# Altium footprint library SMD Passive.PcbLib: 136 footprints (part 8 of 9)
Each footprint in its own frame and in the unit in brackets; x right, y up, seen from the top. Pads: shape width x height; smd on the part's side, far side on the other; paste and mask are expansions set on the pad; w line width, h text height; cw(c..) or ccw(c..) is an arc to the next point about the centre after c.
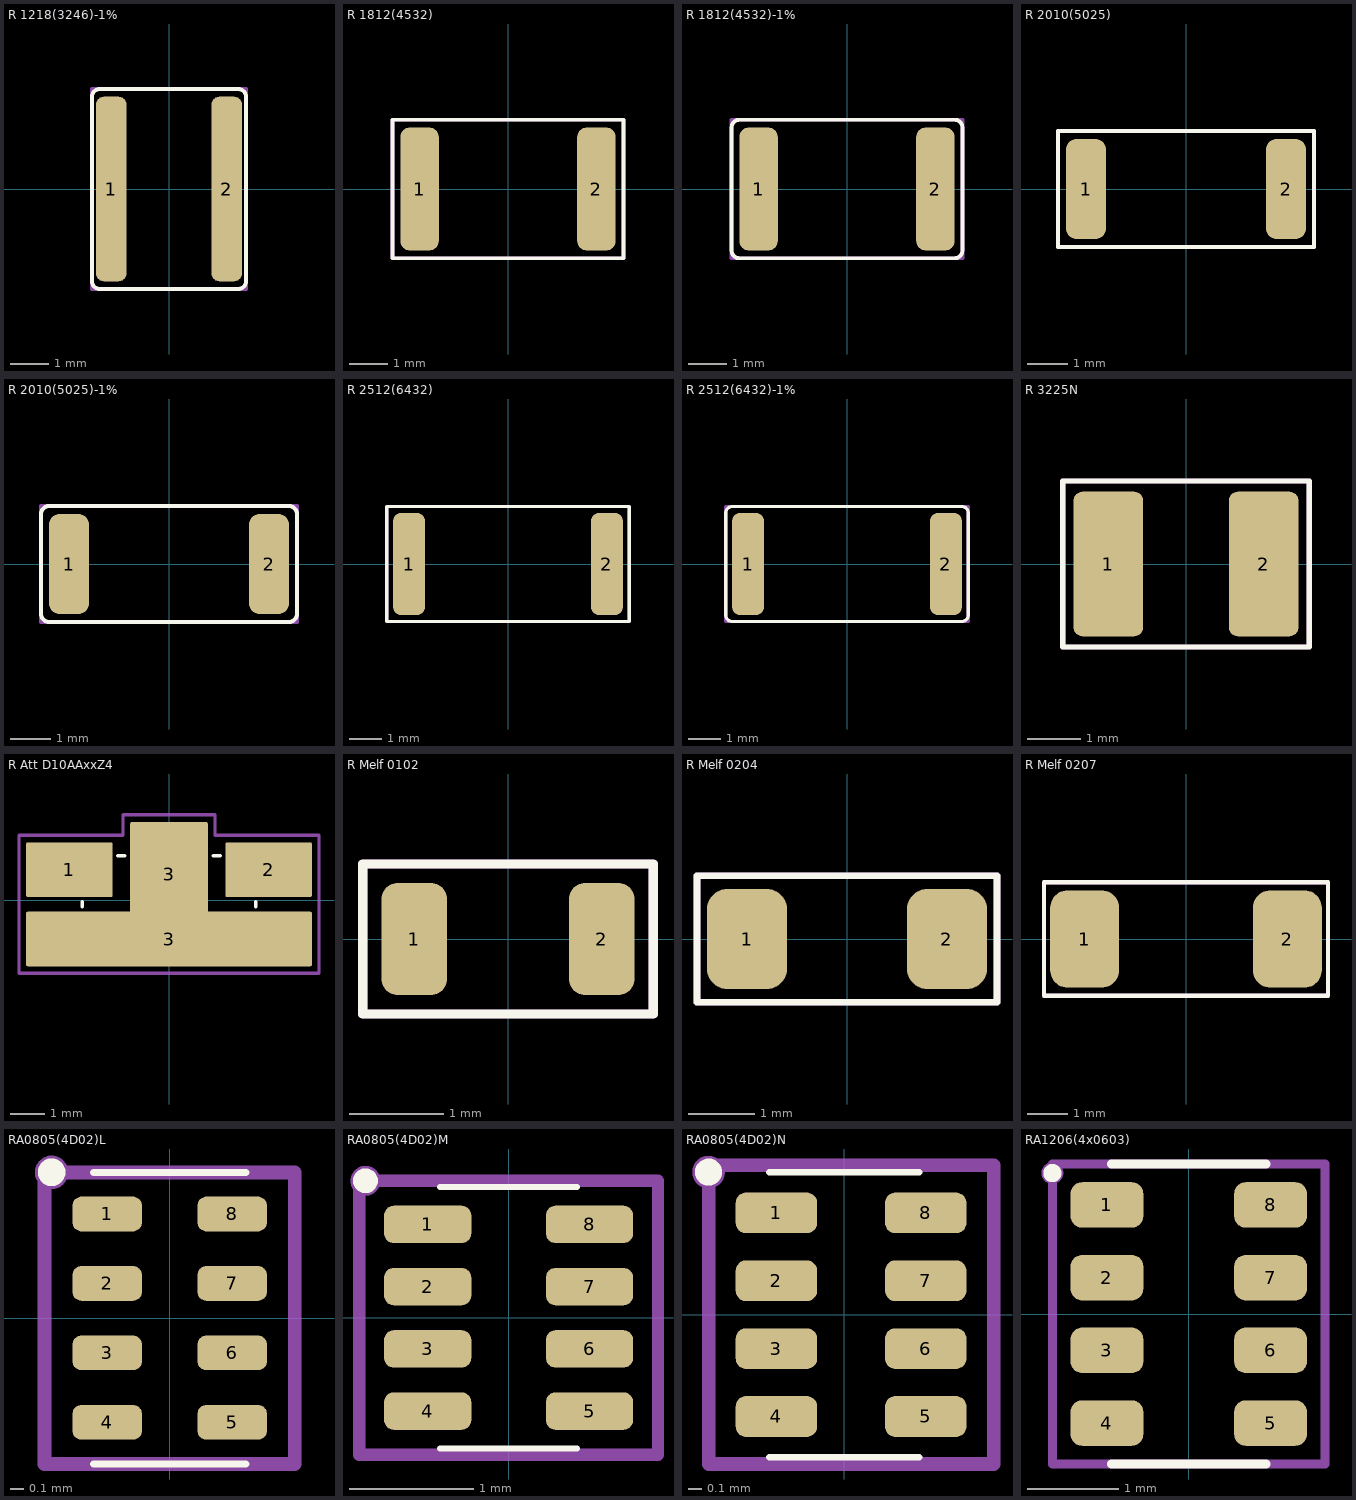
[diagram p7: the footprints below, top view; thin cyan lines are the x and y axes]

## R 1218(3246)-1% [mm]
height 0.55
pads (2):
  rrect50% 0.8x4.8 smd: 1(-1.5,0) 2(1.5,0)
Top Overlay:
  lines w0.1: -2,-2.4 ccw(c-1.8,-2.4) -1.8,-2.6 1.8,-2.6 ccw(c1.8,-2.4) 2,-2.4 2,2.4 ccw(c1.8,2.4) 1.8,2.6 -1.8,2.6 ccw(c-1.8,2.4) -2,2.4 ; -1.998,-2.402 -1.998,2.402
Top Courtyard:
  lines w0.1: -2,-2.6 2,-2.6 2,2.6 -2,2.6 -2,-2.6
3D body "SMD R-1218-1%.STEP": height 0.58, standoff 0.02, extent -1.6,-2.3 1.6,2.3

## R 1812(4532) [mm]
height 0.55
pads (2):
  rrect50% 1x3.2 smd: 1(-2.3,0) 2(2.3,0)
Top Overlay:
  lines w0.1: -3,-1.8 3,-1.8 3,1.8 -3,1.8 -3,-1.8
Top Courtyard:
  lines w0.1: -3,-1.8 3,-1.8 3,1.8 -3,1.8 -3,-1.8
3D body "SMD R-1812.STEP": height 0.6, standoff 0, extent -2.25,-1.6 2.25,1.6

## R 1812(4532)-1% [mm]
height 0.55
pads (2):
  rrect50% 1x3.2 smd: 1(-2.3,0) 2(2.3,0)
Top Overlay:
  lines w0.1: -3,-1.6 ccw(c-2.8,-1.6) -2.8,-1.8 2.8,-1.8 ccw(c2.8,-1.6) 3,-1.6 3,1.6 ccw(c2.8,1.6) 2.8,1.8 -2.8,1.8 ccw(c-2.8,1.6) -3,1.6 -3,-1.6
Top Courtyard:
  lines w0.1: -3,-1.8 3,-1.8 3,1.8 -3,1.8 -3,-1.8
3D body "SMD R-1812-1%.STEP": height 0.6, standoff 0, extent -2.25,-1.6 2.25,1.6

## R 2010(5025) [mm]
height 0.55
pads (2):
  rrect50% 1x2.5 smd: 1(-2.5,0) 2(2.5,0)
Top Overlay:
  lines w0.1: -3.2,-1.45 3.2,-1.45 3.2,1.45 -3.2,1.45 -3.2,-1.45
Top Courtyard:
  lines w0.1: -3.2,1.445 -3.2,-1.45 3.2,-1.45 3.2,1.45 -3.2,1.45
3D body "SMD R-2010.STEP": height 0.62, standoff 0, extent -2.502,-1.244 2.502,1.246

## R 2010(5025)-1% [mm]
height 0.55
pads (2):
  rrect50% 1x2.5 smd: 1(-2.5,0) 2(2.5,0)
Top Overlay:
  lines w0.1: -3.2,-1.249 ccw(c-2.999,-1.249) -2.999,-1.45 3,-1.45 ccw(c3,-1.25) 3.2,-1.25 3.2,1.25 ccw(c3,1.25) 3,1.45 -3,1.45 ccw(c-3,1.25) -3.2,1.25 -3.2,-1.249
Top Courtyard:
  lines w0.1: -3.2,-1.45 3.2,-1.45 3.2,1.45 -3.2,1.45 -3.2,-1.45
3D body "SMD R-2010-1%.STEP": height 0.62, standoff 0, extent -2.502,-1.244 2.502,1.245

## R 2512(6432) [mm]
height 0.55
pads (2):
  rrect50% 1x3.2 smd: 1(-3.1,0) 2(3.1,0)
Top Overlay:
  lines w0.1: -3.8,-1.8 3.8,-1.8 3.8,1.8 -3.8,1.8 -3.8,-1.8
Top Courtyard:
  lines w0.1: -3.8,1.8 -3.8,-1.8 3.8,-1.8 3.8,1.8 -3.798,1.8
3D body "SMD R-2512.STEP": height 0.62, standoff 0, extent -3.16,-1.6 3.16,1.6

## R 2512(6432)-1% [mm]
height 0.55
pads (2):
  rrect50% 1x3.2 smd: 1(-3.1,0) 2(3.1,0)
Top Overlay:
  lines w0.1: -3.8,-1.601 ccw(c-3.601,-1.601) -3.601,-1.8 3.6,-1.8 ccw(c3.6,-1.6) 3.8,-1.6 3.8,1.601 ccw(c3.601,1.601) 3.601,1.8 -3.6,1.8 ccw(c-3.6,1.6) -3.8,1.6 -3.8,-1.601
Top Courtyard:
  lines w0.1: -3.8,-1.8 3.8,-1.8 3.8,1.8 -3.8,1.8 -3.8,-1.8
3D body "SMD R-2512-1%.STEP": height 0.62, standoff 0, extent -3.16,-1.6 3.16,1.6

## R 3225N [mm] "Chip Resistor, Body 3.2x2.5mm, IPC Medium Density"
height 0.55
pads (2):
  rrect25% 1.3x2.7 smd: 1(-1.45,0) 2(1.45,0)
Top Overlay:
  lines w0.1: -2.3,-1.55 2.3,-1.55 2.3,1.55 -2.3,1.55 -2.3,-1.55
Top Courtyard:
  lines w0.1: -2.3,-1.55 2.3,-1.55 2.3,1.55 -2.3,1.55 -2.3,-1.55
3D body: height 0.71, standoff 0, extent -1.675,-1.32 1.675,1.32

## R Att D10AAxxZ4 [mil]
pads (4):
  rrect5% 100x63 smd: 1(-115,35) 2(115,35)
  rrect5% 330x63 smd: 3(0,-45)
  rrect5% 90x120 smd: 3(0,30)
Top Layer:
  lines w1: -96,10 -70,10 -70,45 -96,45
Top Overlay:
  lines w3.94: -100.39,-7.87 -100.39,-1.97 ; -59.06,51.18 -51.18,51.18 ; 51.18,51.18 59.06,51.18 ; 100.39,-7.87 100.39,-1.97
Top Courtyard:
  lines w3.94: -173.23,-84.65 173.23,-84.65 173.23,74.8 53.15,74.8 53.15,98.43 -53.15,98.43 -53.15,74.8 -173.23,74.8 -173.23,-84.65
3D body: height 25.98, standoff 25, extent -96,-46 96,45
3D body: height 25, standoff 0, extent -100,-50 100,50

## R Melf 0102 [mm]
height 1.1
pads (2):
  rrect50% 0.7x1.2 smd: 1(-1,0) 2(1,0)
Top Overlay:
  lines w0.1: -1.55,-0.8 -1.55,0.8 1.55,0.8 1.55,-0.8 -1.55,-0.8
Top Courtyard:
  lines w0.1: -1.55,-0.8 1.55,-0.8 1.55,0.8 -1.55,0.8 -1.55,-0.8
3D body "Melf-0102.STEP": height 1.25, standoff 0.15, extent -1,-0.55 1,0.55

## R Melf 0204 [mm]
height 0.55
pads (2):
  rrect50% 1.2x1.5 smd: 1(-1.5,0) 2(1.5,0)
Top Overlay:
  lines w0.1: -2.25,-0.95 2.25,-0.95 2.25,0.95 -2.25,0.95 -2.25,-0.95
Top Courtyard:
  lines w0.1: -2.25,-0.95 2.25,-0.95 2.25,0.95 -2.25,0.95 -2.25,-0.95
3D body "Melf-0204.STEP": height 1.4, standoff 0, extent -1.7,-0.7 1.7,0.7

## R Melf 0207 [mm] "Metal Electrode Face (MELF) Diode; Body 5 x 2.5 mm (LxDia)"
height 2.5
pads (2):
  rrect50% 1.7x2.4 smd: 1(-2.5,0) 2(2.5,0)
Top Overlay:
  lines w0.1: -3.5,-1.4 -3.5,1.4 3.5,1.4 3.5,-1.4 -3.5,-1.4
Top Courtyard:
  lines w0.1: -3.5,-1.4 3.5,-1.4 3.5,1.4 -3.5,1.4 -3.5,-1.4
3D body "Melf-0207.STEP": height 2.2, standoff 0, extent -2.65,-1.1 2.65,1.1

## RA0805(4D02)L [mm] "Chip Array, Flat, 8-Leads, Pitch 0.50mm,  Body 2.00x1.00mm,  IPC High Density"
height 0.45
pads (8):
  rrect50% 0.5x0.25 smd: 1(-0.45,0.75) 2(-0.45,0.25) 3(-0.45,-0.25) 4(-0.45,-0.75) 5(0.45,-0.75) 6(0.45,-0.25) 7(0.45,0.25) 8(0.45,0.75)
Top Overlay:
  circle w0.1: c-0.85,1.05 r0.05
  lines w0.05: -0.55,-1.05 0.55,-1.05 ; -0.55,1.05 0.55,1.05
Top Assembly:
  circle w0.12: c-0.85,1.05 r0.06
Top Courtyard:
  lines w0.1: -0.9,-1.05 0.9,-1.05 0.9,1.05 -0.9,1.05 -0.9,-1.05
3D body "RA 741C083 (2x1mm).STEP": height 0.35, standoff -0.03, extent -0.502,-1 0.502,1

## RA0805(4D02)M [mm] "Chip Array, Flat, 8-Leads, Pitch 0.50mm,  Body 2.00x1.00mm,  IPC Medium Density"
height 0.45
pads (8):
  rrect50% 0.7x0.3 smd: 1(-0.65,0.75) 2(-0.65,0.25) 3(-0.65,-0.25) 4(-0.65,-0.75) 5(0.65,-0.75) 6(0.65,-0.25) 7(0.65,0.25) 8(0.65,0.75)
Top Overlay:
  circle w0.1: c-1.15,1.1 r0.05
  lines w0.05: -0.55,-1.05 0.55,-1.05 ; -0.55,1.05 0.55,1.05
Top Assembly:
  circle w0.12: c-1.15,1.1 r0.06
Top Courtyard:
  lines w0.1: -1.2,-1.1 -1.2,1.1 1.2,1.1 1.2,-1.1 -1.2,-1.1
3D body "RA 741C083 (2x1mm).STEP": height 0.35, standoff -0.03, extent -0.502,-1 0.502,1

## RA0805(4D02)N [mm] "Chip Array, Flat, 8-Leads, Pitch 0.50mm,  Body 2.00x1.00mm,  IPC Medium Density"
height 0.45
pads (8):
  rrect50% 0.6x0.3 smd: 1(-0.5,0.75) 2(-0.5,0.25) 3(-0.5,-0.25) 4(-0.5,-0.75) 5(0.6,-0.75) 6(0.6,-0.25) 7(0.6,0.25) 8(0.6,0.75)
Top Overlay:
  circle w0.1: c-1,1.05 r0.05
  lines w0.05: -0.55,-1.05 0.55,-1.05 ; -0.55,1.05 0.55,1.05
Top Assembly:
  circle w0.12: c-1,1.05 r0.06
Top Courtyard:
  lines w0.1: -1,-1.1 1.1,-1.1 1.1,1.1 -1,1.1 -1,-1.1
3D body "RA 741C083 (2x1mm).STEP": height 0.35, standoff -0.03, extent -0.502,-1 0.502,1

## RA1206(4x0603) [mm]
pads (8):
  rrect50% 0.8x0.5 smd: 1(-0.9,1.2) 2(-0.9,0.4) 3(-0.9,-0.4) 4(-0.9,-1.2) 5(0.9,-1.2) 6(0.9,-0.4) 7(0.9,0.4) 8(0.9,1.2)
Top Overlay:
  circle w0.1: c-1.5,1.55 r0.05
  lines w0.1: -0.85,-1.65 0.85,-1.65 ; -0.85,1.65 0.85,1.65
Top Assembly:
  circle w0.12: c-1.5,1.55 r0.06
Top Courtyard:
  lines w0.1: -1.5,-1.65 -1.5,1.65 1.5,1.65 1.5,-1.65 -1.5,-1.65
3D body "SMD R1206-4Way-Var2-1.STEP": height 0.5, standoff 0, extent -0.8,-1.6 0.8,1.6